# Altium integrated library STM32F417 Demo Board.IntLib: 69 symbols
Pins are listed as number, name and electrical type; pins without a type are passive.

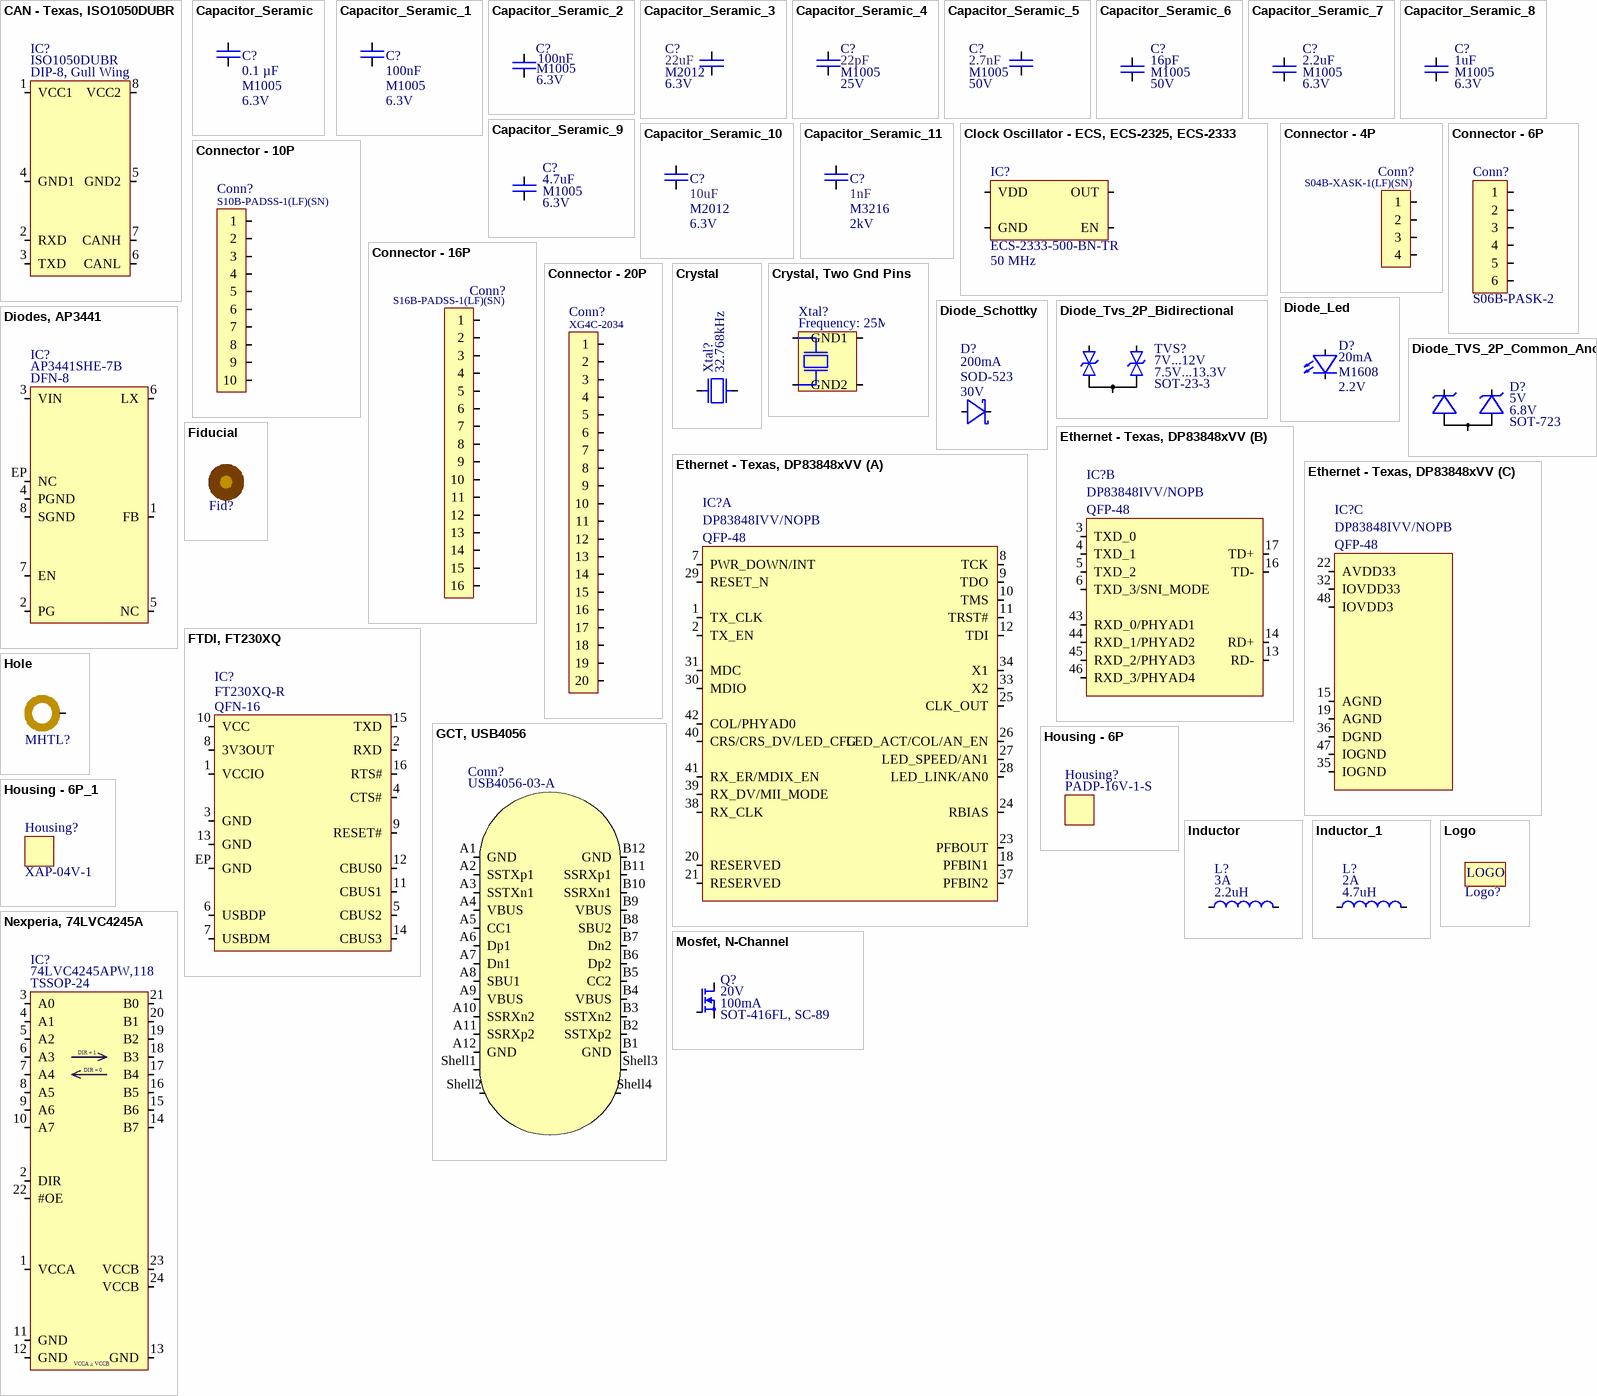
[diagram p0: symbols CAN - Texas, ISO1050DUBR to Nexperia, 74LVC4245A]

## CAN - Texas, ISO1050DUBR
designator IC?  Manufacturer Part Number: ISO1050DUBR  Package: DIP-8, Gull Wing  (hidden comment: CAN - Texas, ISO1050DUBR)
IC, Interface, CAN, DIP-8; Manufacturer: Texas Instruments; ComponentLink1Description: Datasheet; ComponentLink1URL: C:\Users\Public\Documents\Altium\env\Datasheets\IC - Interface\Texas, ISO1050DUBR.pdf; ComponentLink2Description: Supplier Link; ComponentLink2URL: https://www.digikey.com/en/products/detail/texas-instruments/iso1050dubr/2094633; Supplier Part Number: 296-24818-1-ND; Supplier Link: https://www.digikey.com/en/products/detail/texas-instruments/iso1050dubr/2094633; Supplier Currency: $; Supplier: Digikey; Quantity, Min: 1; Quantity, Max: 100; Price, Min: $3.72000; Price, Max: $2.32380; Operating Temperature, Min: -55℃; Operating Temperature, Max: +105℃; Component Type: Interface; Component Category: IC
footprint DIP-8, Gull Wing
pins: 1 VCC1, 2 RXD, 3 TXD, 4 GND1, 5 GND2, 6 CANL, 7 CANH, 8 VCC2

## Capacitor_Seramic
designator C?  value 0.1 µF  Package: M1005  Rated Voltage: 6.3V  (hidden comment: Capacitor_Seramic)
Manufacturer Part Number: 04026D104KAT4A; Manufacturer: KYOCERA AVX; Tolerance: ±10%; Temperature Coefficient: X5R; ComponentLink1Description: Datasheet; ComponentLink1URL: C:\Users\Public\Documents\Altium\env\Datasheets\Capacitor\Kyocera X5R Ceramic.pdf; ComponentLink2Description: Supplier Link; ComponentLink2URL: https://www.digikey.com/en/products/detail/kyocera-avx/04026D104KAT4A/8107673; Supplier Part Number: 478-11504-1-ND; Supplier Link: https://www.digikey.com/en/products/detail/kyocera-avx/04026D104KAT4A/8107673; Supplier Currency: $; Supplier: Digikey; Quantity, Min: 1; Quantity, Max: 50,000; Price, Min: $0.08000; Price, Max: $0.00240; Operating Temperature, Min: -55℃; Operating Temperature, Max: +85℃; Component Type: Ceramic; Component Category: Capacitor
footprint Capacitor_Seramic_M603_I0201 (Capacitor, Seramic, M603, I0201)
footprint Capacitor_Seramic_M1005_I0402 (Capacitor, Seramic, M1005, I0402)
footprint Capacitor_Seramic_M1608_I0603 (Capacitor, Seramic, M1608, I0603)
footprint Capacitor_Seramic_M3216_I1206 (Capacitor, Seramic, M3216, I1206)
footprint Capacitor_Seramic_M3225_I1210 (Capacitor, Seramic, M3225, I1210)
footprint Capacitor_Seramic_M3246_I1812 (Capacitor, Seramic, M3246, I1812)
footprint Capacitor_Seramic_M5025_I2010 (Capacitor, Seramic, M5025, I2010)
footprint Capacitor_Seramic_M6332_I2512 (Capacitor, Seramic, M1332, I2512)
footprint Capacitor_Seramic_M2012_I0805 (Capacitor, Seramic, M2012, I0805)
pins: 1, 2

## Capacitor_Seramic_1
designator C?, comment value 100nF  Package: M1005  Rated Voltage: 6.3V  (hidden comment: Capacitor_Seramic)
Manufacturer Part Number: 04026D104KAT4A; Manufacturer: KYOCERA AVX; Tolerance: ±10%; Temperature Coefficient: X5R; ComponentLink1Description: Datasheet; ComponentLink1URL: C:\Users\Public\Documents\Altium\env\Datasheets\Capacitor\Kyocera X5R Ceramic.pdf; ComponentLink2Description: Supplier Link; ComponentLink2URL: https://www.digikey.com/en/products/detail/kyocera-avx/04026D104KAT4A/8107673; Supplier Part Number: 478-11504-1-ND; Supplier Link: https://www.digikey.com/en/products/detail/kyocera-avx/04026D104KAT4A/8107673; Supplier Currency: $; Supplier: Digikey; Quantity, Min: 1; Quantity, Max: 50,000; Price, Min: $0.08000; Price, Max: $0.00240; Operating Temperature, Min: -55℃; Operating Temperature, Max: +85℃; Component Type: Ceramic; Component Category: Capacitor
footprint Capacitor_Seramic_M603_I0201 (Capacitor, Seramic, M603, I0201)
footprint Capacitor_Seramic_M1005_I0402 (Capacitor, Seramic, M1005, I0402)
footprint Capacitor_Seramic_M1608_I0603 (Capacitor, Seramic, M1608, I0603)
footprint Capacitor_Seramic_M3216_I1206 (Capacitor, Seramic, M3216, I1206)
footprint Capacitor_Seramic_M3225_I1210 (Capacitor, Seramic, M3225, I1210)
footprint Capacitor_Seramic_M3246_I1812 (Capacitor, Seramic, M3246, I1812)
footprint Capacitor_Seramic_M5025_I2010 (Capacitor, Seramic, M5025, I2010)
footprint Capacitor_Seramic_M6332_I2512 (Capacitor, Seramic, M1332, I2512)
footprint Capacitor_Seramic_M2012_I0805 (Capacitor, Seramic, M2012, I0805)
pins: 1, 2

## Capacitor_Seramic_2
designator C?, comment value 100nF  Package: M1005  Rated Voltage: 6.3V  (hidden comment: Capacitor_Seramic)
Manufacturer Part Number: 04026D104KAT4A; Manufacturer: KYOCERA AVX; Tolerance: ±10%; Temperature Coefficient: X5R; ComponentLink1Description: Datasheet; ComponentLink1URL: C:\Users\Public\Documents\Altium\env\Datasheets\Capacitor\Kyocera X5R Ceramic.pdf; ComponentLink2Description: Supplier Link; ComponentLink2URL: https://www.digikey.com/en/products/detail/kyocera-avx/04026D104KAT4A/8107673; Supplier Part Number: 478-11504-1-ND; Supplier Link: https://www.digikey.com/en/products/detail/kyocera-avx/04026D104KAT4A/8107673; Supplier Currency: $; Supplier: Digikey; Quantity, Min: 1; Quantity, Max: 50,000; Price, Min: $0.08000; Price, Max: $0.00240; Operating Temperature, Min: -55℃; Operating Temperature, Max: +85℃; Component Type: Ceramic; Component Category: Capacitor
footprint Capacitor_Seramic_M603_I0201 (Capacitor, Seramic, M603, I0201)
footprint Capacitor_Seramic_M1005_I0402 (Capacitor, Seramic, M1005, I0402)
footprint Capacitor_Seramic_M1608_I0603 (Capacitor, Seramic, M1608, I0603)
footprint Capacitor_Seramic_M3216_I1206 (Capacitor, Seramic, M3216, I1206)
footprint Capacitor_Seramic_M3225_I1210 (Capacitor, Seramic, M3225, I1210)
footprint Capacitor_Seramic_M3246_I1812 (Capacitor, Seramic, M3246, I1812)
footprint Capacitor_Seramic_M5025_I2010 (Capacitor, Seramic, M5025, I2010)
footprint Capacitor_Seramic_M6332_I2512 (Capacitor, Seramic, M1332, I2512)
footprint Capacitor_Seramic_M2012_I0805 (Capacitor, Seramic, M2012, I0805)
pins: 1, 2

## Capacitor_Seramic_3
designator C?, comment value 22uF  Package: M2012  Rated Voltage: 6.3V  (hidden comment: Capacitor_Seramic)
Cap, Cer, 22uF, 6.3V, M2012; Manufacturer Part Number: GRM21BR60J226ME39K; Manufacturer: Murata; Tolerance: 20%; Temperature Coefficient: X5R; ComponentLink1Description: Datasheet; ComponentLink1URL: C:\Users\User\OneDrive - Karadeniz Teknik University\Masaüstü\pcb\Altium-Designer-ile-Elektronik-Devre-Karti-Tasarimi_2024-main\Datasheets\Capacitor\Murata - Multilayer Ceramic Capacitors.pdf; ComponentLink2Description: Supplier Link; ComponentLink2URL: https://www.digikey.com/en/products/detail/murata-electronics/GRM21BR60J226ME39K/2546881; Supplier Part Number: 490-6471-1-ND; Supplier Link: https://www.digikey.com/en/products/detail/murata-electronics/GRM21BR60J226ME39K/2546881; Supplier Currency: $; Supplier: Digikey; Quantity, Min: 1; Quantity, Max: 30,000; Price, Min: $0.21000; Price, Max: $0.02815; Operating Temperature, Min: -55℃; Operating Temperature, Max: +85℃; Component Type: Ceramic; Component Category: Capacitor
footprint Capacitor_Seramic_M603_I0201 (Capacitor, Seramic, M603, I0201)
footprint Capacitor_Seramic_M1005_I0402 (Capacitor, Seramic, M1005, I0402)
footprint Capacitor_Seramic_M1608_I0603 (Capacitor, Seramic, M1608, I0603)
footprint Capacitor_Seramic_M3216_I1206 (Capacitor, Seramic, M3216, I1206)
footprint Capacitor_Seramic_M3225_I1210 (Capacitor, Seramic, M3225, I1210)
footprint Capacitor_Seramic_M3246_I1812 (Capacitor, Seramic, M3246, I1812)
footprint Capacitor_Seramic_M5025_I2010 (Capacitor, Seramic, M5025, I2010)
footprint Capacitor_Seramic_M6332_I2512 (Capacitor, Seramic, M1332, I2512)
footprint Capacitor_Seramic_M2012_I0805 (Capacitor, Seramic, M2012, I0805)
pins: 1, 2

## Capacitor_Seramic_4
designator C?, comment value 22pF  Package: M1005  Rated Voltage: 25V  (hidden comment: Capacitor_Seramic)
Cap, Cer, 22pF, 25V, M1005; Manufacturer Part Number: 0402N220J250CT; Manufacturer: Walsin; Tolerance: 5%; Temperature Coefficient: C0G, NP0; ComponentLink1Description: Datasheet; ComponentLink1URL: C:\Users\User\OneDrive - Karadeniz Teknik University\Masaüstü\pcb\Altium-Designer-ile-Elektronik-Devre-Karti-Tasarimi_2024-main\Datasheets\Capacitor\Walsin - Multilayer Ceramic Capacitors.pdf; ComponentLink2Description: Supplier Link; ComponentLink2URL: https://www.digikey.com/en/products/detail/walsin-technology-corporation/0402N220J250CT/9354779; Supplier Part Number: 1292-1282-1-ND; Supplier Link: https://www.digikey.com/en/products/detail/walsin-technology-corporation/0402N220J250CT/9354779; Supplier Currency: $; Supplier: Digikey; Quantity, Min: 1; Quantity, Max: 250,000; Price, Min: $0.10000; Price, Max: $0.00128; Operating Temperature, Min: -55℃; Operating Temperature, Max: +125℃; Component Type: Ceramic; Component Category: Capacitor
footprint Capacitor_Seramic_M603_I0201 (Capacitor, Seramic, M603, I0201)
footprint Capacitor_Seramic_M1005_I0402 (Capacitor, Seramic, M1005, I0402)
footprint Capacitor_Seramic_M1608_I0603 (Capacitor, Seramic, M1608, I0603)
footprint Capacitor_Seramic_M3216_I1206 (Capacitor, Seramic, M3216, I1206)
footprint Capacitor_Seramic_M3225_I1210 (Capacitor, Seramic, M3225, I1210)
footprint Capacitor_Seramic_M3246_I1812 (Capacitor, Seramic, M3246, I1812)
footprint Capacitor_Seramic_M5025_I2010 (Capacitor, Seramic, M5025, I2010)
footprint Capacitor_Seramic_M6332_I2512 (Capacitor, Seramic, M1332, I2512)
footprint Capacitor_Seramic_M2012_I0805 (Capacitor, Seramic, M2012, I0805)
pins: 1, 2

## Capacitor_Seramic_5
designator C?, comment value 2.7nF  Package: M1005  Rated Voltage: 50V  (hidden comment: Capacitor_Seramic)
Cap, Cer, 2.7nF, 50V, M1005; Manufacturer Part Number: CC0402KRX7R9BB272; Manufacturer: Yageo; Tolerance: 10%; Temperature Coefficient: X7R; ComponentLink1Description: Datasheet; ComponentLink1URL: C:\Users\User\OneDrive - Karadeniz Teknik University\Masaüstü\pcb\Altium-Designer-ile-Elektronik-Devre-Karti-Tasarimi_2024-main\Datasheets\Capacitor\Yageo - Surface-Mount Ceramic Multilayer Capacitors.pdf; ComponentLink2Description: Supplier Link; ComponentLink2URL: https://www.digikey.com/en/products/detail/yageo/CC0402KRX7R9BB272/302767; Supplier Part Number: 311-1033-1-ND; Supplier Link: https://www.digikey.com/en/products/detail/yageo/CC0402KRX7R9BB272/302767; Supplier Currency: $; Supplier: Digikey; Quantity, Min: 1; Quantity, Max: 250,000; Price, Min: $0.10000; Price, Max: $0.00128; Operating Temperature, Min: -55℃; Operating Temperature, Max: +125℃; Component Type: Ceramic; Component Category: Capacitor
footprint Capacitor_Seramic_M603_I0201 (Capacitor, Seramic, M603, I0201)
footprint Capacitor_Seramic_M1005_I0402 (Capacitor, Seramic, M1005, I0402)
footprint Capacitor_Seramic_M1608_I0603 (Capacitor, Seramic, M1608, I0603)
footprint Capacitor_Seramic_M3216_I1206 (Capacitor, Seramic, M3216, I1206)
footprint Capacitor_Seramic_M3225_I1210 (Capacitor, Seramic, M3225, I1210)
footprint Capacitor_Seramic_M3246_I1812 (Capacitor, Seramic, M3246, I1812)
footprint Capacitor_Seramic_M5025_I2010 (Capacitor, Seramic, M5025, I2010)
footprint Capacitor_Seramic_M6332_I2512 (Capacitor, Seramic, M1332, I2512)
footprint Capacitor_Seramic_M2012_I0805 (Capacitor, Seramic, M2012, I0805)
pins: 1, 2

## Capacitor_Seramic_6
designator C?, comment value 16pF  Package: M1005  Rated Voltage: 50V  (hidden comment: Capacitor_Seramic)
Cap, Cer, 16pF, 50V, M1005; Manufacturer Part Number: 0402N160J500CT; Manufacturer: Walsin; Tolerance: 5%; Temperature Coefficient: C0G, NP0; ComponentLink1Description: Datasheet; ComponentLink1URL: C:\Users\Public\Documents\Altium\env\Datasheets\Capacitor\Walsin - Multilayer Ceramic Capacitors.pdf; ComponentLink2Description: Supplier Link; ComponentLink2URL: https://www.digikey.com/en/products/detail/walsin-technology-corporation/0402N160J500CT/9354759; Supplier Part Number: 1292-1262-1-ND; Supplier Link: https://www.digikey.com/en/products/detail/walsin-technology-corporation/0402N160J500CT/9354759; Supplier Currency: $; Supplier: Digikey; Quantity, Min: 1; Quantity, Max: 250,000; Price, Min: $0.10000; Price, Max: $0.00182; Operating Temperature, Min: -55℃; Operating Temperature, Max: +125℃; Component Type: Ceramic; Component Category: Capacitor
footprint Capacitor_Seramic_M603_I0201 (Capacitor, Seramic, M603, I0201)
footprint Capacitor_Seramic_M1005_I0402 (Capacitor, Seramic, M1005, I0402)
footprint Capacitor_Seramic_M1608_I0603 (Capacitor, Seramic, M1608, I0603)
footprint Capacitor_Seramic_M3216_I1206 (Capacitor, Seramic, M3216, I1206)
footprint Capacitor_Seramic_M3225_I1210 (Capacitor, Seramic, M3225, I1210)
footprint Capacitor_Seramic_M3246_I1812 (Capacitor, Seramic, M3246, I1812)
footprint Capacitor_Seramic_M5025_I2010 (Capacitor, Seramic, M5025, I2010)
footprint Capacitor_Seramic_M6332_I2512 (Capacitor, Seramic, M1332, I2512)
footprint Capacitor_Seramic_M2012_I0805 (Capacitor, Seramic, M2012, I0805)
pins: 1, 2

## Capacitor_Seramic_7
designator C?, comment value 2.2uF  Package: M1005  Rated Voltage: 6.3V  (hidden comment: Capacitor_Seramic)
Cap, Cer, 1uF, 6.3V, M1005; Manufacturer Part Number: CL05A225MQ5NNNC; Manufacturer: Samsung; Tolerance: 20%; Temperature Coefficient: X5R; ComponentLink1Description: Datasheet; ComponentLink1URL: C:\Users\Public\Documents\Altium\env\Datasheets\Capacitor\Samsung - Multi Layer Ceramic Capacitors.pdf; ComponentLink2Description: Supplier Link; ComponentLink2URL: https://www.digikey.com/en/products/detail/samsung-electro-mechanics/CL05A225MQ5NNNC/3887127; Supplier Part Number: 1276-1469-1-ND; Supplier Link: https://www.digikey.com/en/products/detail/samsung-electro-mechanics/CL05A225MQ5NNNC/3887127; Supplier Currency: $; Supplier: Digikey; Quantity, Min: 1; Quantity, Max: 10,000; Price, Min: $0.08000; Price, Max: $0.00241; Operating Temperature, Min: -55℃; Operating Temperature, Max: +85℃; Component Type: Ceramic; Component Category: Capacitor
footprint Capacitor_Seramic_M603_I0201 (Capacitor, Seramic, M603, I0201)
footprint Capacitor_Seramic_M1005_I0402 (Capacitor, Seramic, M1005, I0402)
footprint Capacitor_Seramic_M1608_I0603 (Capacitor, Seramic, M1608, I0603)
footprint Capacitor_Seramic_M3216_I1206 (Capacitor, Seramic, M3216, I1206)
footprint Capacitor_Seramic_M3225_I1210 (Capacitor, Seramic, M3225, I1210)
footprint Capacitor_Seramic_M3246_I1812 (Capacitor, Seramic, M3246, I1812)
footprint Capacitor_Seramic_M5025_I2010 (Capacitor, Seramic, M5025, I2010)
footprint Capacitor_Seramic_M6332_I2512 (Capacitor, Seramic, M1332, I2512)
footprint Capacitor_Seramic_M2012_I0805 (Capacitor, Seramic, M2012, I0805)
pins: 1, 2

## Capacitor_Seramic_8
designator C?, comment value 1uF  Package: M1005  Rated Voltage: 6.3V  (hidden comment: Capacitor_Seramic)
Cap, Cer, 1uF, 6.3V, M1005; Manufacturer Part Number: CL05A105MQ5NNNC; Manufacturer: Samsung; Tolerance: 20%; Temperature Coefficient: X5R; ComponentLink1Description: Datasheet; ComponentLink1URL: C:\Users\Public\Documents\Altium\env\Datasheets\Capacitor\Samsung - Multi Layer Ceramic Capacitors.pdf; ComponentLink2Description: Supplier Link; ComponentLink2URL: https://www.digikey.com/en/products/detail/samsung-electro-mechanics/CL05A105MQ5NNNC/3886893; Supplier Part Number: 1276-1235-1-ND; Supplier Link: https://www.digikey.com/en/products/detail/samsung-electro-mechanics/CL05A105MQ5NNNC/3886893; Supplier Currency: $; Supplier: Digikey; Quantity, Min: 1; Quantity, Max: 250,000; Price, Min: $0.10000; Price, Max: $0.00211; Operating Temperature, Min: -55℃; Operating Temperature, Max: +85℃; Component Type: Ceramic; Component Category: Capacitor
footprint Capacitor_Seramic_M603_I0201 (Capacitor, Seramic, M603, I0201)
footprint Capacitor_Seramic_M1005_I0402 (Capacitor, Seramic, M1005, I0402)
footprint Capacitor_Seramic_M1608_I0603 (Capacitor, Seramic, M1608, I0603)
footprint Capacitor_Seramic_M3216_I1206 (Capacitor, Seramic, M3216, I1206)
footprint Capacitor_Seramic_M3225_I1210 (Capacitor, Seramic, M3225, I1210)
footprint Capacitor_Seramic_M3246_I1812 (Capacitor, Seramic, M3246, I1812)
footprint Capacitor_Seramic_M5025_I2010 (Capacitor, Seramic, M5025, I2010)
footprint Capacitor_Seramic_M6332_I2512 (Capacitor, Seramic, M1332, I2512)
footprint Capacitor_Seramic_M2012_I0805 (Capacitor, Seramic, M2012, I0805)
pins: 1, 2

## Capacitor_Seramic_9
designator C?, comment value 4.7uF  Package: M1005  Rated Voltage: 6.3V  (hidden comment: Capacitor_Seramic)
Cap, Cer, 1uF, 6.3V, M1005; Manufacturer Part Number: CL10A475KQ8NNNC; Manufacturer: Samsung; Tolerance: 10%; Temperature Coefficient: X5R; ComponentLink1Description: Datasheet; ComponentLink1URL: C:\Users\Public\Documents\Altium\env\Datasheets\Capacitor\Samsung - Multi Layer Ceramic Capacitors.pdf; ComponentLink2Description: Supplier Link; ComponentLink2URL: https://www.digikey.com/en/products/detail/samsung-electro-mechanics/CL10A475KQ8NNNC/3886703; Supplier Part Number: 1276-1045-1-ND; Supplier Link: https://www.digikey.com/en/products/detail/samsung-electro-mechanics/CL10A475KQ8NNNC/3886703; Supplier Currency: $; Supplier: Digikey; Quantity, Min: 1; Quantity, Max: 4,000; Price, Min: $0.08000; Price, Max: $0.00431; Operating Temperature, Min: -55℃; Operating Temperature, Max: +85℃; Component Type: Ceramic; Component Category: Capacitor
footprint Capacitor_Seramic_M603_I0201 (Capacitor, Seramic, M603, I0201)
footprint Capacitor_Seramic_M1005_I0402 (Capacitor, Seramic, M1005, I0402)
footprint Capacitor_Seramic_M1608_I0603 (Capacitor, Seramic, M1608, I0603)
footprint Capacitor_Seramic_M3216_I1206 (Capacitor, Seramic, M3216, I1206)
footprint Capacitor_Seramic_M3225_I1210 (Capacitor, Seramic, M3225, I1210)
footprint Capacitor_Seramic_M3246_I1812 (Capacitor, Seramic, M3246, I1812)
footprint Capacitor_Seramic_M5025_I2010 (Capacitor, Seramic, M5025, I2010)
footprint Capacitor_Seramic_M6332_I2512 (Capacitor, Seramic, M1332, I2512)
footprint Capacitor_Seramic_M2012_I0805 (Capacitor, Seramic, M2012, I0805)
pins: 1, 2

## Capacitor_Seramic_10
designator C?, comment value 10uF  Package: M2012  Rated Voltage: 6.3V  (hidden comment: Capacitor_Seramic)
Cap, Cer, 10uF, 6.3V, M2012; Manufacturer Part Number: CL21A106MQFNNNE; Manufacturer: Samsung; Tolerance: 20%; Temperature Coefficient: X5R; ComponentLink1Description: Datasheet; ComponentLink1URL: C:\Users\User\OneDrive - Karadeniz Teknik University\Masaüstü\pcb\Altium-Designer-ile-Elektronik-Devre-Karti-Tasarimi_2024-main\Datasheets\Capacitor\Walsin - Multilayer Ceramic Capacitors.pdf; ComponentLink2Description: Supplier Link; ComponentLink2URL: https://www.digikey.com/en/products/detail/walsin-technology-corporation/0402N220J250CT/9354779; Supplier Part Number: 1292-1282-1-ND; Supplier Link: https://www.digikey.com/en/products/detail/samsung-electro-mechanics/CL21A106MQFNNNE/3886956; Supplier Currency: $; Supplier: Digikey; Quantity, Min: 1; Quantity, Max: 50,000; Price, Min: $0.10000; Price, Max: $0.00846; Operating Temperature, Min: -55℃; Operating Temperature, Max: +85℃; Component Type: Ceramic; Component Category: Capacitor
footprint Capacitor_Seramic_M603_I0201 (Capacitor, Seramic, M603, I0201)
footprint Capacitor_Seramic_M1005_I0402 (Capacitor, Seramic, M1005, I0402)
footprint Capacitor_Seramic_M1608_I0603 (Capacitor, Seramic, M1608, I0603)
footprint Capacitor_Seramic_M3216_I1206 (Capacitor, Seramic, M3216, I1206)
footprint Capacitor_Seramic_M3225_I1210 (Capacitor, Seramic, M3225, I1210)
footprint Capacitor_Seramic_M3246_I1812 (Capacitor, Seramic, M3246, I1812)
footprint Capacitor_Seramic_M5025_I2010 (Capacitor, Seramic, M5025, I2010)
footprint Capacitor_Seramic_M6332_I2512 (Capacitor, Seramic, M1332, I2512)
footprint Capacitor_Seramic_M2012_I0805 (Capacitor, Seramic, M2012, I0805)
pins: 1, 2

## Capacitor_Seramic_11
designator C?, comment value 1nF  Package: M3216  Rated Voltage: 2kV  (hidden comment: Capacitor_Seramic)
Cap, Cer, 1nF, 2kV, M3216; Manufacturer Part Number: CC1206MKX7RDBB102; Manufacturer: Yageo; Tolerance: 20%; Temperature Coefficient: X7R; ComponentLink1Description: Datasheet; ComponentLink1URL: C:\Users\User\OneDrive - Karadeniz Teknik University\Masaüstü\pcb\Altium-Designer-ile-Elektronik-Devre-Karti-Tasarimi_2024-main\Datasheets\Capacitor\Walsin - Multilayer Ceramic Capacitors.pdf; ComponentLink2Description: Supplier Link; ComponentLink2URL: https://www.digikey.com/en/products/detail/yageo/CC1206MKX7RDBB102/5884663; Supplier Part Number: 311-4501-1-ND; Supplier Link: https://www.digikey.com/en/products/detail/yageo/CC1206MKX7RDBB102/5884663; Supplier Currency: $; Supplier: Digikey; Quantity, Min: 1; Quantity, Max: 75,000; Price, Min: $0.23000; Price, Max: $0.03901; Operating Temperature, Min: -55℃; Operating Temperature, Max: +125℃; Component Type: Ceramic; Component Category: Capacitor
footprint Capacitor_Seramic_M603_I0201 (Capacitor, Seramic, M603, I0201)
footprint Capacitor_Seramic_M1005_I0402 (Capacitor, Seramic, M1005, I0402)
footprint Capacitor_Seramic_M1608_I0603 (Capacitor, Seramic, M1608, I0603)
footprint Capacitor_Seramic_M3216_I1206 (Capacitor, Seramic, M3216, I1206)
footprint Capacitor_Seramic_M3225_I1210 (Capacitor, Seramic, M3225, I1210)
footprint Capacitor_Seramic_M3246_I1812 (Capacitor, Seramic, M3246, I1812)
footprint Capacitor_Seramic_M5025_I2010 (Capacitor, Seramic, M5025, I2010)
footprint Capacitor_Seramic_M6332_I2512 (Capacitor, Seramic, M1332, I2512)
footprint Capacitor_Seramic_M2012_I0805 (Capacitor, Seramic, M2012, I0805)
pins: 1, 2

## Clock Oscillator - ECS, ECS-2325, ECS-2333
designator IC?  Manufacturer Part Number: ECS-2333-500-BN-TR  Frequency: 50 MHz  (hidden comment: Clock Oscillator - ECS, ECS-2325, ECS-2333)
IC, Oscillator, 50 MHz; Manufacturer: ESC; ComponentLink1Description: Datasheet; ComponentLink1URL: C:\Users\Public\Documents\Altium\env\Datasheets\IC - Clock, Timing, Oscillator\Clock Oscillator - ECS, ECS-2325, ECS-2333.pdf; ComponentLink2Description: Supplier Link; ComponentLink2URL: https://www.digikey.com/en/products/detail/ecs-inc/ecs-2333-500-bn-tr/3927356; Supplier Part Number: XC1930CT-ND; Supplier Link: https://www.digikey.com/en/products/detail/ecs-inc/ecs-2333-500-bn-tr/3927356; Supplier Currency: $; Supplier: Digikey; Quantity, Min: 1; Quantity, Max: 500; Price, Min: $0.90000; Price, Max: $0.61814; Operating Temperature, Min: -40℃; Operating Temperature, Max: +85℃; Component Type: Clock, Timing, Oscillator; Component Category: IC; Package: Flat, 3.2mm x 2.5mm
footprint Clock Oscillator - ECS, ECS-2325, ECS-2333
pins: EN, GND, OUT, VDD

## Connector - 4P
designator Conn?  Manufacturer Part Number: S04B-XASK-1(LF)(SN)  (hidden comment: Connector - 4P)
Conn, JST, 4P, TH, XA, Side Entry; ComponentLink1Description: Datasheet; ComponentLink1URL: C:\Users\Public\Documents\Altium\env\Datasheets\Connector - JST\XA Family.pdf; ComponentLink2Description: Supplier Link; ComponentLink2URL: https://www.digikey.com/en/products/detail/jst-sales-america-inc/S04B-XASK-1-LF-SN/7230506; Supplier: Digikey; Supplier Part Number: 455-4090-ND; Manufacturer: JST; Operating Temperature, Min: -25℃; Operating Temperature, Max: +85℃; Quantity, Min: 1; Quantity, Max: 10,000; Price, Min: $0.40000; Supplier Currency: $; Price, Max: $0.21016; Supplier Link: https://www.digikey.com/en/products/detail/jst-sales-america-inc/S04B-XASK-1-LF-SN/7230506; Component Type: PCB; Component Category: Connector; Package: SMD, TH, Side Entry
footprint Connector, S04B-XASK-1
pins: 1, 2, 3, 4

## Connector - 6P
designator Conn?  Manufacturer Part Number: S06B-PASK-2  (hidden comment: Connector - 6P)
Connector, 6Pin; Manufacturer: JST; ComponentLink1Description: Datasheet; ComponentLink1URL: C:\Users\Public\Documents\Altium\env\Datasheets\Connector\S06B-PASK-2(LF)(SN).pdf; ComponentLink2Description: Supplier Link; ComponentLink2URL: https://www.digikey.com/en/products/detail/jst-sales-america-inc/S06B-PASK-2/926757?s=N4IgTCBcDaIMoAYBsAhAtABQIJwNJrAAoAZAMQEpC4A5ckAXQF8g; Supplier Part Number: 455-S06B-PASK-2-ND; Supplier Link: https://www.digikey.com/en/products/detail/jst-sales-america-inc/S06B-PASK-2/926757?s=N4IgTCBcDaIMoAYBsAhAtABQIJwNJrAAoAZAMQEpC4A5ckAXQF8g; Supplier Currency: $; Supplier: Digikey; Quantity, Min: 1; Quantity, Max: 10,000; Price, Min: $0.38000; Price, Max: $0.20057; Operating Temperature, Min: -25℃; Operating Temperature, Max: +85℃; Component Type: PCB; Component Category: Connector; Package: TH, Side
footprint Connector, S06B-PASK-2 (Richtek, RT2862xSP, SOP, 8Pin)
pins: 1, 2, 3, 4, 5, 6

## Connector - 10P
designator Conn?  Manufacturer Part Number: S10B-PADSS-1(LF)(SN)  (hidden comment: Connector - 10P)
Conn, JST, 10P, TH, PAD, Side Entry; ComponentLink1Description: Datasheet; ComponentLink1URL: C:\Users\Public\Documents\Altium\env\Datasheets\Connector - JST\PAD Family.pdf; ComponentLink2Description: Supplier Link; ComponentLink2URL: https://www.digikey.com/en/products/detail/jst-sales-america-inc/S10B-PADSS-1-LF-SN/1634773; Supplier: Digikey; Supplier Part Number: 455-2032-ND; Manufacturer: JST; Operating Temperature, Min: -25℃; Operating Temperature, Max: +85℃; Quantity, Min: *; Quantity, Max: *; Price, Min: *; Supplier Currency: $; Price, Max: *; Supplier Link: https://www.digikey.com/en/products/detail/jst-sales-america-inc/S10B-PADSS-1-LF-SN/1634773; Component Type: PCB; Component Category: Connector; Package: TH, 2 Rows, RA, Side Entry
footprint Connector, S10B-PADSS-1
pins: 1, 2, 3, 4, 5, 6, 7, 8, 9, 10
2 alternate drawings of the same symbol

## Connector - 16P
designator Conn?  Manufacturer Part Number: S16B-PADSS-1(LF)(SN)  (hidden comment: Connector - 16P)
Conn, JST, 16P, TH, PAD, Side Entry; ComponentLink1Description: Datasheet; ComponentLink1URL: C:\Users\Public\Documents\Altium\env\Datasheets\Connector - JST\PAD Family.pdf; ComponentLink2Description: Supplier Link; ComponentLink2URL: https://www.digikey.com/en/products/detail/jst-sales-america-inc/S16B-PADSS-1-LF-SN/1634778; Supplier: Digikey; Supplier Part Number: 455-2037-ND; Manufacturer: JST; Operating Temperature, Min: -25℃; Operating Temperature, Max: +85℃; Quantity, Min: 1; Quantity, Max: 10,080; Price, Min: $0.62000; Supplier Currency: $; Price, Max: $0.33258; Supplier Link: https://www.digikey.com/en/products/detail/jst-sales-america-inc/S16B-PADSS-1-LF-SN/1634778; Component Type: PCB; Component Category: Connector; Package: TH, 2 Rows, RA, Side Entry
footprint Connector, S16B-PADSS-1
pins: 1, 2, 3, 4, 5, 6, 7, 8, 9, 10, 11, 12, 13, 14, 15, 16
2 alternate drawings of the same symbol

## Connector - 20P
designator Conn?  Manufacturer Part Number: XG4C-2034  (hidden comment: Connector - 20P)
Conn, Header, 20P, RA, TH, Shrouded; Manufacturer: Omron; ComponentLink1Description: Datasheet; ComponentLink1URL: E:\Altium\Datasheets\Connector - Header\Connector - Omron, XG4 Series.pdf; ComponentLink2Description: Supplier Link; ComponentLink2URL: https://www.digikey.com/en/products/detail/omron-electronics-inc-emc-div/XG4C-2034/1787182; Supplier: Digikey; Supplier Part Number: OR900-ND; Operating Temperature, Min: -55℃; Operating Temperature, Max: +105℃; Quantity, Min: 1; Quantity, Max: 450; Price, Min: 1.97; Supplier Currency: $; Price, Max: 1.27716; Supplier Link: https://www.digikey.com/en/products/detail/omron-electronics-inc-emc-div/XG4C-2034/1787182; Component Type: Header; Component Category: Connector; Package: TH, RA, Shrouded
footprint Connector - Omron, XG4C-2034
pins: 1, 2, 3, 4, 5, 6, 7, 8, 9, 10, 11, 12, 13, 14, 15, 16, 17, 18, 19, 20
2 alternate drawings of the same symbol

## Crystal
designator Xtal?  Frequency: 32.768kHz  (hidden comment: Crystal)
XTAL, 32.768kHz, 12.5pF; Manufacturer: NDK; Manufacturer Part Number: NX3215SA-32.768K-STD-MUS-2; ComponentLink1Description: Datasheet; ComponentLink1URL: C:\Users\Public\Documents\Altium\env\Datasheets\Crystal\NDK, NX3215SA.pdf; ComponentLink2Description: Supplier Link; ComponentLink2URL: https://www.digikey.com/en/products/detail/ndk-america-inc/NX3215SA-32-768K-STD-MUS-2/2349033; Supplier: Digikey; Supplier Part Number: 644-1159-1-ND; Operating Temperature, Min: -40*℃; Operating Temperature, Max: +125*℃; Quantity, Min: 1; Quantity, Max: 21,000; Price, Min: $0.63000; Supplier Currency: $; Price, Max: $0.34424; Supplier Link: https://www.digikey.com/en/products/detail/ndk-america-inc/NX3215SA-32-768K-STD-MUS-2/2349033; Component Type: Crystal; Component Category: Crystal; Package: SMD
footprint NDK, NX3215SA
pins: 1, 2

## Crystal, Two Gnd Pins
designator Xtal?  Frequency: 25MHz  (hidden comment: Crystal, Two Gnd Pins)
XTAL, 25MHz, 12pF; Manufacturer: Kyocera; Manufacturer Part Number: CX3225SB25000H0FLJCC; ComponentLink1Description: Datasheet; ComponentLink1URL: C:\Users\Public\Documents\Altium\env\Datasheets\Crystal\Kyocera, CX3225SB.pdf; ComponentLink2Description: Supplier Link; ComponentLink2URL: https://www.digikey.com/en/products/detail/kyocera-avx/cx3225sb25000h0fljcc/6123312; Supplier: Digikey; Supplier Part Number: 478-CX3225SB25000H0FLJCCCT-ND; Operating Temperature, Min: -30℃; Operating Temperature, Max: +85℃; Quantity, Min: 1; Quantity, Max: 21,000; Price, Min: $0.66000; Supplier Currency: $; Price, Max: $0.36682; Supplier Link: https://www.digikey.com/en/products/detail/kyocera-avx/cx3225sb25000h0fljcc/6123312; Component Type: Crystal; Component Category: Crystal; Package: SMD
footprint Kyocera, CX3225SB
pins: 1, 2, GND1, GND2

## Diode_Led
designator D?  Current: 20mA  Package: M1608  Voltage: 2.2V  (hidden comment: Diode_Led)
Manufacturer Part Number: SML-D12U1WT86; Manufacturer: Rohm Semiconductor; Component Category: Diode; ComponentLink1Description: Datasheet; ComponentLink1URL: C:\Users\Public\Documents\Altium\env\Datasheets\Diode\Rohm_LED_Red.pdf; ComponentLink2Description: Supplier Link; ComponentLink2URL: https://www.digikey.com/en/products/detail/rohm-semiconductor/sml-d12u1wt86/5843853; Component Type: LED; Supplier Link: https://www.digikey.com/en/products/detail/rohm-semiconductor/sml-d12u1wt86/5843853; Supplier Currency: $; Price, Max: $0.02318; Price, Min: $0.12000; Quantity, Max: 300000; Quantity, Min: 1; Operating Temperature, Max: +85℃; Operating Temperature, Min: -40℃; Supplier Part Number: SML-D12U1WT86CT-ND; Supplier: Digikey
footprint Diode_SMD_M1608_I0603_Blue (Diode, LED, Blue, SMD, M1608, I0603)
footprint Diode_SMD_M1608_I0603_Green (Diode, LED, Green, SMD, M1608, I0603)
footprint Diode_SMD_M1608_I0603_Green_Yellow (Diode, LED, Green-Yelow, SMD, M1608, I0603)
footprint Diode_SMD_M1608_I0603_Red (Diode, LED, Red, SMD, M1608, I0603)
footprint Diode_SMD_M1608_I0603_Orange_1 (Diode, LED, Orange 1, SMD, M1608, I0603)
footprint Diode_SMD_M1608_I0603_Orange_2 (Diode, LED, Orange 2, SMD, M1608, I0603)
footprint Diode_SMD_M1608_I0603_White (Diode, LED, White, SMD, M1608, I0603)
footprint Diode_SMD_M1608_I0603_Yellow (Diode, LED, Yellow, SMD, M1608, I0603)
pins: A Anode, K Katode
8 alternate drawings of the same symbol

## Diode_Schottky
designator D?  Current: 200mA  Package: SOD-523  Voltage: 30V  (hidden comment: Diode_Schottky)
Diode, Schottky, 30V, 200mA, SOD-523; Manufacturer Part Number: CES521,L3F; Manufacturer: Toshiba; ComponentLink1Description: Datasheet; ComponentLink1URL: C:\Users\Public\Documents\Altium\env\Datasheets\Diode\Toshiba_CES521_Schottky_Diode.pdf; ComponentLink2Description: Supplier Link; ComponentLink2URL: https://www.digikey.com/en/products/detail/toshiba-semiconductor-and-storage/CES521-L3F/3522356; Component Category: Diode; Component Type: Schottky; Supplier Link: https://www.digikey.com/en/products/detail/toshiba-semiconductor-and-storage/CES521-L3F/3522356; Supplier Currency: $; Price, Max: $0.01500; Price, Min: $0.13000; Quantity, Max: 16,000; Quantity, Min: 1; Operating Temperature, Max: +125℃; Operating Temperature, Min: ---℃; Supplier Part Number: CES521L3FCT-ND; Supplier: Digikey
footprint Diode_SOD-523_SC-79 (Diode, SMD, SOD-523, SC-79)
footprint Diode_SOD-123F (Diode, SMD, SOD-123F)
pins: A Anode, K Katode

## Diode_Tvs_2P_Bidirectional
designator TVS?  Voltage, Break Down: 7.5V...13.3V  Voltage, Stand Off: 7V...12V  Package: SOT-23-3  (hidden comment: Diode_Tvs_2P_Bidirectional)
TVS, 2P, Bidirectional, 7V/12V, SOT-23-3; Manufacturer Part Number: CDSOT23-SM712; Manufacturer: Bourns; Component Category: Diode; ComponentLink1Description: Datasheet; ComponentLink1URL: C:\Users\Public\Documents\Altium\env\Datasheets\Diode\Bourns, CDSOT23-SM712.pdf; ComponentLink2Description: Supplier Link; ComponentLink2URL: https://www.digikey.com/en/products/detail/bourns-inc/CDSOT23-SM712/1630592; Supplier: Digikey; Supplier Part Number: CDSOT23-SM712CT-ND; Operating Temperature, Min: -55℃; Operating Temperature, Max: +150℃; Quantity, Min: 1; Quantity, Max: 15,000; Price, Min: $; Price, Max: $0.25000; Supplier Currency: $; Supplier Link: https://www.digikey.com/en/products/detail/bourns-inc/CDSOT23-SM712/1630592; Component Type: TVS
footprint Diode_SOT-23-3_2P_Bidirectional_Type_1
pins: Common, D1, D2

## Diode_TVS_2P_Common_Anode
designator D?  Voltage, Break Down: 6.8V  Package: SOT-723  Voltage, Stand OFF: 5V  (hidden comment: Diode_TVS_2P_Common_Anode)
Diode, TVS, 5V/6.8V, SOD-723; Manufacturer Part Number: DF3A6.8LFV,L3F; Manufacturer: Toshiba; ComponentLink1Description: Datasheet; ComponentLink1URL: C:\Users\Public\Documents\Altium\env\Datasheets\Diode\Toshiba_DF3A6.8LFV_TVS_Diode.pdf; ComponentLink2Description: Supplier Link; ComponentLink2URL: https://www.digikey.com/en/products/detail/toshiba-semiconductor-and-storage/DF3A6-8LFV-L3F/4305070; Component Category: Diode; Component Type: TVS; Supplier Link: https://www.digikey.com/en/products/detail/toshiba-semiconductor-and-storage/DF3A6-8LFV-L3F/4305070; Supplier Currency: $; Price, Max: $0.02250; Price, Min: $0.14000; Quantity, Max: 8,000; Quantity, Min: 1; Operating Temperature, Max: *℃; Operating Temperature, Min: *℃; Supplier Part Number: DF3A6.8LFVL3FCT-ND; Supplier: Digikey
footprint Diode_SOT-723_2P_Common_Anode_Type_1 (Diode, TVS, SMD, SOT-723, Common Anode, Type 1)
pins: A Anode, K1 Katode 1, K2 Katode 2

## Diodes, AP3441
designator IC?  Manufacturer Part Number: AP3441SHE-7B  Package: DFN-8  (hidden comment: Diodes, AP3441)
IC, Power, DC-DC, Diodes, AP3441; ComponentLink1Description: Datasheet; ComponentLink1URL: C:\Users\Public\Documents\Altium\env\Datasheets\IC - Power - DC-DC\Diodes, AP3441.pdf; ComponentLink2Description: Supplier Link; ComponentLink2URL: https://www.digikey.com/en/products/detail/diodes-incorporated/AP3441SHE-7B/9765636; Supplier Part Number: AP3441SHE-7BDICT-ND; Supplier Link: https://www.digikey.com/en/products/detail/diodes-incorporated/AP3441SHE-7B/9765636; Supplier Currency: $; Supplier: Digikey; Quantity, Min: 1; Quantity, Max: 1,000; Price, Min: $0.31000; Price, Max: $0.13728; Operating Temperature, Min: -40℃; Operating Temperature, Max: +85℃; Manufacturer: Diodes; Component Type: IC; Component Category: Power
footprint DFN-8, 2mm x 2mm, 0,5mm (DFN, 8Pin, 4mm x 4mm, 0.65mm)
pins: 1 FB, 2 PG, 3 VIN, 4 PGND, 5 NC, 6 LX, 7 EN, 8 SGND, EP NC

## Ethernet - Texas, DP83848xVV
designator IC?  Manufacturer Part Number: DP83848IVV/NOPB  Package: QFP-48  (hidden comment: Ethernet - Texas, DP83848xVV)
IC, Interface, Eth Phy, 10/100Mb, DP83848IVV; ComponentLink1Description: Datasheet; ComponentLink1URL: C:\Users\Public\Documents\Altium\env\Datasheets\IC - Interface\Ethernet - Texas, DP83848.pdf; ComponentLink2Description: Supplier Link; ComponentLink2URL: https://www.digikey.com/en/products/detail/texas-instruments/DP83848IVV-NOPB/947543; Supplier: Digikey; Supplier Part Number: DP83848IVV/NOPB-ND; Manufacturer: Texas; Operating Temperature, Min: -40℃; Operating Temperature, Max: +85℃; Quantity, Min: 1; Quantity, Max: 2,500; Price, Min: $6.93000; Supplier Currency: $; Price, Max: $3.95780; Supplier Link: https://www.digikey.com/en/products/detail/texas-instruments/DP83848IVV-NOPB/947543; Component Type: Interface; Component Category: IC
footprint QFP-48, 7mm x 7mm, 0.5mm
part A pins: 1 TX_CLK, 2 TX_EN, 7 PWR_DOWN/INT, 8 TCK, 9 TDO, 10 TMS, 11 TRST#, 12 TDI, 18 PFBIN1, 20 RESERVED, 21 RESERVED, 23 PFBOUT, 24 RBIAS, 25 CLK_OUT, 26 LED_ACT/COL/AN_EN, 27 LED_SPEED/AN1, 28 LED_LINK/AN0, 29 RESET_N, 30 MDIO, 31 MDC, 33 X2, 34 X1, 37 PFBIN2, 38 RX_CLK, 39 RX_DV/MII_MODE, 40 CRS/CRS_DV/LED_CFG, 41 RX_ER/MDIX_EN, 42 COL/PHYAD0
part B pins: 3 TXD_0, 4 TXD_1, 5 TXD_2, 6 TXD_3/SNI_MODE, 13 RD-, 14 RD+, 16 TD-, 17 TD+, 43 RXD_0/PHYAD1, 44 RXD_1/PHYAD2, 45 RXD_2/PHYAD3, 46 RXD_3/PHYAD4
part C pins: 15 AGND, 19 AGND, 22 AVDD33, 32 IOVDD33, 35 IOGND, 36 DGND, 47 IOGND, 48 IOVDD3

## Fiducial
designator Fid?  (value not drawn)  (no BOM)
Component Category: Mechanical; Component Type: Fiducial
footprint Fiducial - 2mm, 5mm
footprint Fiducial, Panel - 2mm, 5mm
footprint Fiducial - 2mm, 5mm (SON)

## FTDI, FT230XQ
designator IC?  Manufacturer Part Number: FT230XQ-R  Package: QFN-16  (hidden comment: FTDI, FT230XQ)
IC, Interface, FTDI, QFN-16; ComponentLink1Description: Datasheet; ComponentLink1URL: C:\Users\Public\Documents\Altium\env\Datasheets\IC - Interface\FTDI, FT230XQ.pdf; ComponentLink2Description: Supplier Link; ComponentLink2URL: https://www.digikey.com/en/products/detail/ftdi-future-technology-devices-international-ltd/FT230XQ-R/3029142; Supplier Part Number: 768-1130-1-ND; Supplier Link: https://www.digikey.com/en/products/detail/ftdi-future-technology-devices-international-ltd/FT230XQ-R/3029142; Supplier Currency: $; Supplier: Digikey; Quantity, Min: 1; Quantity, Max: 5,000; Price, Min: $2.26000; Price, Max: $1.63030; Operating Temperature, Min: -40℃; Operating Temperature, Max: +85℃; Manufacturer: FTDI; Component Type: Interface; Component Category: IC
footprint QFN-16, 4mm x 4mm, 0,65mm (QFN, 16Pin, 4mm x 4mm, 0.65mm)
pins: 1 VCCIO, 2 RXD, 3 GND, 4 CTS#, 5 CBUS2, 6 USBDP, 7 USBDM, 8 3V3OUT, 9 RESET#, 10 VCC, 11 CBUS1, 12 CBUS0, 13 GND, 14 CBUS3, 15 TXD, 16 RTS#, EP GND

## GCT, USB4056
designator Conn?  Manufacturer Part Number: USB4056-03-A  (hidden comment: GCT, USB4056)
Connector, USB, Type-C; ComponentLink1Description: Datasheet; ComponentLink1URL: C:\Users\Public\Documents\Altium\env\Datasheets\Connector - USB\GCT, USB4056.pdf; ComponentLink2Description: Supplier Link; ComponentLink2URL: https://www.digikey.com/en/products/detail/gct/usb4056-03-a/14638038; Supplier Part Number: 2073-USB4056-03-ACT-ND; Supplier Link: https://www.digikey.com/en/products/detail/gct/usb4056-03-a/14638038; Supplier Currency: $; Supplier: Digikey; Quantity, Min: 1; Quantity, Max: 10,000; Price, Min: $0.91000; Price, Max: $0.47490; Operating Temperature, Min: -25℃; Operating Temperature, Max: +85℃; Manufacturer: GCT; Component Type: PCB; Component Category: Connector; Package: Type-C
footprint GCT, USB4056 (Connector, USB, Type-C)
pins: A1 GND, A2 SSTXp1, A3 SSTXn1, A4 VBUS, A5 CC1, A6 Dp1, A7 Dn1, A8 SBU1, A9 VBUS, A10 SSRXn2, A11 SSRXp2, A12 GND, B1 GND, B2 SSTXp2, B3 SSTXn2, B4 VBUS, B5 CC2, B6 Dp2, B7 Dn2, B8 SBU2, B9 VBUS, B10 SSRXn1, B11 SSRXp1, B12 GND, Shell1 Chassis1, Shell2 Chassis2, Shell3 Chassis3, Shell4 Chassis4

## Hole
designator MHTL?  (value not drawn)  (no BOM)
Mounting Hole; Component Category: Mechanical; Component Type: Mounting Hole
footprint Mounting Hole - Hole-3.2mm, Pad-5mm (Mounting Hole, Hole-3.2mm, Pad-5mm)
pins: Hole

## Housing - 6P
designator Housing?  Manufacturer Part Number: PADP-16V-1-S  (hidden comment: Housing - 6P)
Housing, 6Pin; Manufacturer: JST; Component Category: Connector; ComponentLink1Description: Datasheet; ComponentLink1URL: C:\Users\Public\Documents\Altium\env\Datasheets\Connector\PAP-06V-S.pdf; ComponentLink2Description: Supplier Link; ComponentLink2URL: https://www.digikey.com/en/products/detail/jst-sales-america-inc/PADP-16V-1-S/1300224?s=N4IgTCBcDaIAoEEAicC0BGAbANQyAugL5A; Supplier Part Number: 455-2143-ND; Supplier Link: https://www.digikey.com/en/products/detail/jst-sales-america-inc/PADP-16V-1-S/1300224?s=N4IgTCBcDaIAoEEAicC0BGAbANQyAugL5A; Supplier Currency: $; Supplier: Digikey; Quantity, Min: 1; Quantity, Max: 3,000; Price, Min: $0.26000; Price, Max: $0.14985; Operating Temperature, Min: -25℃; Operating Temperature, Max: +85℃; Component Type: PCB; Package: Housing
footprint Housing, PAP-06V-S
footprint Housing, PADP-10V-1-S
footprint Housing, PADP-16V-1-S
footprint Housing, XAP-04V-1

## Housing - 6P_1
designator Housing?, comment Manufacturer Part Number: XAP-04V-1  (hidden comment: Housing - 6P)
Housing, JST, 4P, XA; Component Category: Connector; ComponentLink1Description: Datasheet; ComponentLink1URL: C:\Users\Public\Documents\Altium\env\Datasheets\Connector\PAP-06V-S.pdf; ComponentLink2Description: Supplier Link; ComponentLink2URL: https://www.digikey.com/en/products/detail/jst-sales-america-inc/XAP-04V-1/959010; Supplier Part Number: 455-2150-ND; Supplier Link: https://www.digikey.com/en/products/detail/jst-sales-america-inc/XAP-04V-1/959010; Supplier Currency: $; Supplier: Digikey; Quantity, Min: 1; Quantity, Max: 3,000; Price, Min: $0.10000; Price, Max: $0.05137; Operating Temperature, Min: -25℃; Operating Temperature, Max: +85℃; Manufacturer: JST; Component Type: PCB; Package: Housing
footprint Housing, PAP-06V-S
footprint Housing, PADP-10V-1-S
footprint Housing, PADP-16V-1-S
footprint Housing, XAP-04V-1

## Inductor
designator L?  value 2.2uH  Saturation Current: 3A  (hidden comment: Inductor)
Manufacturer Part Number: NRS4018T2R2MDGJ; Manufacturer: Taiyo Yuden; ComponentLink1Description: Datasheet; ComponentLink1URL: C:\Users\Public\Documents\Altium\env\Datasheets\Inductor\Taiyo Yuden - NRx Series.pdf; ComponentLink2Description: Supplier Link; ComponentLink2URL: https://www.digikey.com/en/products/detail/taiyo-yuden/nrs4018t2r2mdgj/2648968; Component Category: Inductor; Component Type: Power Inductor; Supplier Link: https://www.digikey.com/en/products/detail/taiyo-yuden/nrs4018t2r2mdgj/2648968; Supplier Currency: $; Price, Max: $0.07087; Price, Min: $0.18000; Quantity, Max: 87,750; Quantity, Min: 1; Operating Temperature, Max: +120℃; Operating Temperature, Min: -25℃; Supplier Part Number: 587-2890-1-ND; Supplier: Digikey; Package: 4x4x1.8 mm
footprint Taiyo Yuden - Power Inductor, 4040TK
footprint Taiyo Yuden - Power Inductor, 5050WK
pins: 1, 2
